# Altium footprint library PcbLib_jp.PcbLib: 255 footprints (part 12 of 16)
Each footprint in its own frame and in the unit in brackets; x right, y up, seen from the top. Pads: shape width x height; smd on the part's side, far side on the other; paste and mask are expansions set on the pad; w line width, h text height; cw(c..) or ccw(c..) is an arc to the next point about the centre after c.
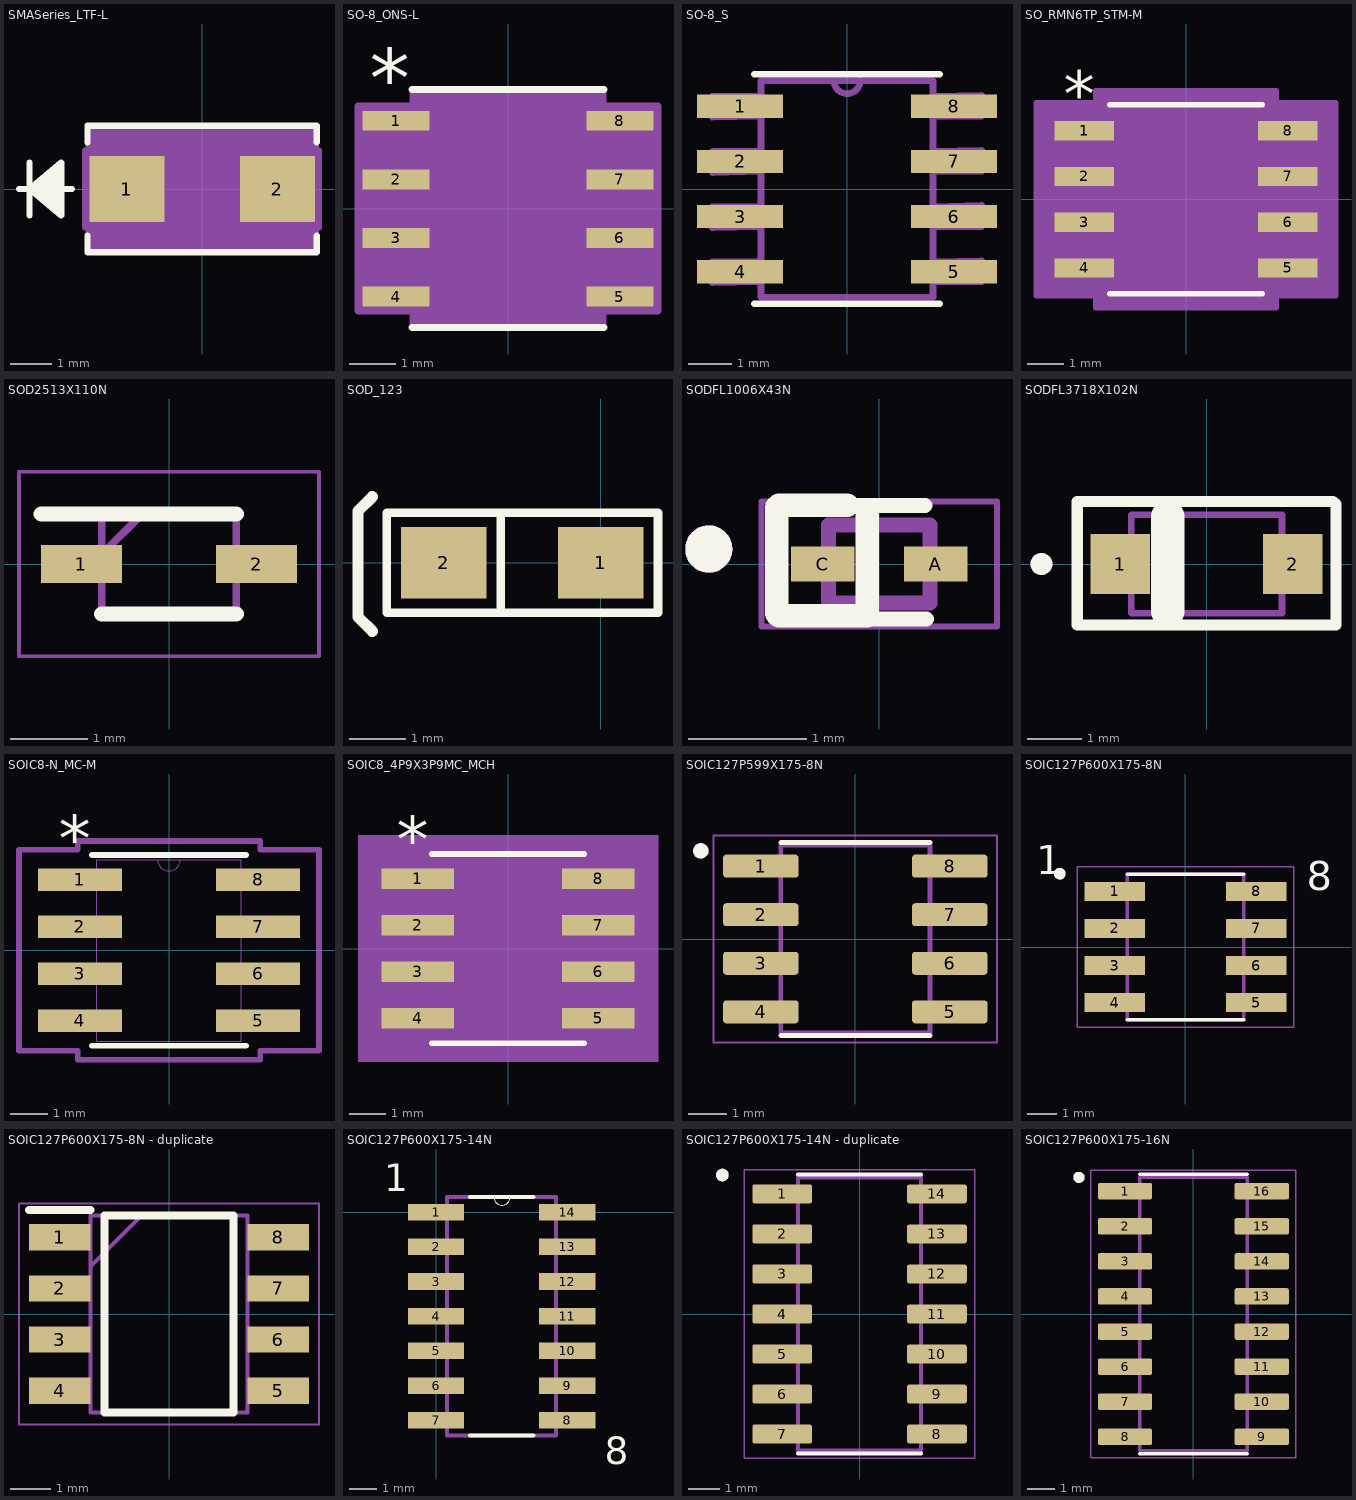
[diagram p11: the footprints below, top view; thin cyan lines are the x and y axes]

## SMASeries_LTF-L [mil]
pads (2):
  rect 71x63 smd paste+0 mask+0: 1(-71.5,0) 2(71.5,0)
Top Overlay:
  lines w6: -174,0 -124,0 ; -164,-25 -164,25 ; -134,-20 -164,0 ; -134,-15 -164,0 ; -134,-10 -164,0 ; -134,-5 -164,0 ; -134,5 -164,0 ; -134,10 -164,0 ; -134,15 -164,0 ; -134,20 -164,0 ; -109,-44.45 -109,-60 109,-60 109,-44.45 ; -109,44.45 -109,60 109,60 109,44.45 ; -164,0 -134,25 -134,-25 -164,0
Mechanical 13:
  lines w1: -174,0 -124,0 ; -164,-25 -164,25 ; -134,-20 -164,0 ; -134,-15 -164,0 ; -134,-10 -164,0 ; -134,-5 -164,0 ; -134,5 -164,0 ; -134,10 -164,0 ; -134,15 -164,0 ; -134,20 -164,0 ; -164,0 -134,25 -134,-25 -164,0 ; -104,-55 104,-55 104,55 -104,55 -104,-55
Mechanical 15:
  region: -108,-36.5 -111,-36.5 -111,36.5 -108,36.5 -108,59 108,59 108,36.5 111,36.5 111,-36.5 108,-36.5 108,-59 -108,-59
  lines w6: -111,-36.5 -111,36.5 -108,36.5 -108,59 108,59 108,36.5 111,36.5 111,-36.5 108,-36.5 108,-59 -108,-59 -108,-36.5 -111,-36.5
3D body "SMASeries_LTF.step": height 92.01, standoff 0, extent -104.02,-55 104.02,55

## SO-8_ONS-L [mil]
pads (8):
  rect 57x17 smd paste+0 mask+0: 1(-95.5,75) 2(-95.5,25) 3(-95.5,-25) 4(-95.5,-75) 5(95.5,-75) 6(95.5,-25) 7(95.5,25) 8(95.5,75)
Top Overlay:
  lines w6: -82,-101.5 82,-101.5 ; -82,101.5 82,101.5
  text "*" at -118,87 h50
Mechanical 13:
  lines w0: -12,96.5 ccw(c0,96.5) 12,96.5
  lines w1: -118,-83.5 -77,-83.5 -77,-66.5 -118,-66.5 -118,-83.5 ; -118,-33.5 -77,-33.5 -77,-16.5 -118,-16.5 -118,-33.5 ; -118,16.5 -77,16.5 -77,33.5 -118,33.5 -118,16.5 ; -118,66.5 -77,66.5 -77,83.5 -118,83.5 -118,66.5 ; -77,-96.5 -77,96.5 77,96.5 77,-96.5 -77,-96.5 ; 77,-83.5 118,-83.5 118,-66.5 77,-66.5 77,-83.5 ; 77,-33.5 118,-33.5 118,-16.5 77,-16.5 77,-33.5 ; 77,16.5 118,16.5 118,33.5 77,33.5 77,16.5 ; 77,66.5 118,66.5 118,83.5 77,83.5 77,66.5
  text "*" at -74.5,43.5 h50
Mechanical 15:
  region: -81,-87.5 -128,-87.5 -128,87.5 -81,87.5 -81,100.5 81,100.5 81,87.5 128,87.5 128,-87.5 81,-87.5 81,-100.5 -81,-100.5
  lines w6: -128,-87.5 -81,-87.5 -81,-100.5 81,-100.5 81,-87.5 128,-87.5 128,87.5 81,87.5 81,100.5 -81,100.5 -81,87.5 -128,87.5 -128,-87.5
3D body "SO-8_ONS.step": height 69.09, standoff 0, extent -117.99,-96.5 117.99,96.5

## SO-8_S [mil]
pads (8):
  rect 78x21 smd: 1(-97,75) 2(-97,25) 3(-97,-25) 4(-97,-75) 5(97,-75) 6(97,-25) 7(97,25) 8(97,75)
Top Overlay:
  lines w6: -84,-104 84,-104 ; -84,104 84,104
Mechanical 13:
  lines w6: -12,98.08 ccw(c0,98.5) 12,98.92 ; -122,-85 -122,-66 -78,-66 -78,-84 -122,-85 ; -122,-35 -122,-16 -78,-16 -78,-34 -122,-35 ; -122,15 -122,34 -78,34 -78,16 -122,15 ; -122,65 -122,84 -78,84 -78,66 -122,65 ; -78,-98 78,-98 78,98 -12,98 -78,98 -78,-98 ; 78,-84 78,-66 122,-65 122,-84 78,-84 ; 78,-34 78,-16 122,-15 122,-34 78,-34 ; 78,16 78,34 122,35 122,16 78,16 ; 78,66 78,84 122,85 122,66 78,66
3D body "CircuitWorks-SO-8.STEP": height 104.24, standoff 47.24, extent -121.62,-98.43 105.87,94.57

## SO_RMN6TP_STM-M [mil]
pads (8):
  rect 65.5x21 smd paste+0 mask+0: 1(-111.25,75) 2(-111.25,25) 3(-111.25,-25) 4(-111.25,-75) 5(111.25,-75) 6(111.25,-25) 7(111.25,25) 8(111.25,75)
Top Overlay:
  lines w6: -83.5,-103.5 83.5,-103.5 ; -83.5,103.5 83.5,103.5
  text "*" at -133.75,91 h50
Mechanical 13:
  lines w0: -12,98.5 ccw(c0,98.5) 12,98.5
  lines w1: -122,-84.5 -78.5,-84.5 -78.5,-65.5 -122,-65.5 -122,-84.5 ; -122,-34.5 -78.5,-34.5 -78.5,-15.5 -122,-15.5 -122,-34.5 ; -122,15.5 -78.5,15.5 -78.5,34.5 -122,34.5 -122,15.5 ; -122,65.5 -78.5,65.5 -78.5,84.5 -122,84.5 -122,65.5 ; -78.5,-98.5 -78.5,98.5 78.5,98.5 78.5,-98.5 -78.5,-98.5 ; 78.5,-84.5 122,-84.5 122,-65.5 78.5,-65.5 78.5,-84.5 ; 78.5,-34.5 122,-34.5 122,-15.5 78.5,-15.5 78.5,-34.5 ; 78.5,15.5 122,15.5 122,34.5 78.5,34.5 78.5,15.5 ; 78.5,65.5 122,65.5 122,84.5 78.5,84.5 78.5,65.5
  text "*" at -76,45.5 h50
Mechanical 15:
  region: -98.5,-105.5 -164,-105.5 -164,105.5 -98.5,105.5 -98.5,118.5 98.5,118.5 98.5,105.5 164,105.5 164,-105.5 98.5,-105.5 98.5,-118.5 -98.5,-118.5
  lines w6: -164,-105.5 -98.5,-105.5 -98.5,-118.5 98.5,-118.5 98.5,-105.5 164,-105.5 164,105.5 98.5,105.5 98.5,118.5 -98.5,118.5 -98.5,105.5 -164,105.5 -164,-105.5
3D body "SO_RMN6TP_STM.step": height 69.09, standoff 0, extent -122.01,-98.5 122.01,98.5

## SOD2513X110N [mm]
pads (2):
  rect 1.05x0.5 smd: 1(-1.138,0) 2(1.138,0)
Top Overlay:
  lines w0.2: -1.662,0.65 0.875,0.65 ; -0.875,-0.65 0.875,-0.65
Mechanical 13:
  lines w0.1: -0.875,0.125 -0.35,0.65 ; -0.875,-0.65 -0.875,0.65 0.875,0.65 0.875,-0.65 -0.875,-0.65
Mechanical 15:
  lines w0.05: -1.95,-1.2 -1.95,1.2 1.95,1.2 1.95,-1.2 -1.95,-1.2
3D body "BAT60AE6327HTSA1.stp": height 1.1, standoff 0, extent -1.25,-0.65 1.25,0.65

## SOD_123 [mil]
pads (2):
  rect 60x50 smd: 1(0,0) 2(-110,0)
Top Overlay:
  lines w1: -150,-35 25,-35 40,-35 40,35 -150,35 -150,-35
  lines w6: 40,-35 0,-35 -150,-35 -150,35 40,35 ; 40,-35 40,35 ; 40,-35 -70,-35 -70,35 -53,35 40,35 ; 40,-35 40,35
  lines w7.87: -160,-48 -170,-38 -170,36 -160,46
3D body "CircuitWorks-SOD123.STEP": height 50, standoff 0, extent -126.84,-31.5 18.83,31.5

## SODFL1006X43N [mm]
pads (2):
  rect 0.54x0.3 smd: A(0.48,0) C(-0.48,0)
Top Overlay:
  circle w0.2: c-1.446,0.127 r0.1
  lines w0.127: -0.41,0.495 0.39,0.495 ; -0.4,-0.465 0.4,-0.465
  lines w0.2: -0.87,0.48 -0.87,-0.42 -0.85,-0.44 -0.1,-0.44 -0.1,0.41 ; -0.85,0.5 -0.27,0.5
Mechanical 13:
  circle w0.2: c-1.446,0.127 r0.1
  lines w0.127: -0.43,-0.33 0.43,-0.33 0.43,0.33 -0.43,0.33 -0.43,-0.33
Mechanical 15:
  lines w0.05: -1,-0.53 1,-0.53 1,0.53 -1,0.53 -1,-0.53

## SODFL3718X102N [mm]
height 1.02
pads (2):
  rect 1.08x1.09 smd: 1(-1.575,0) 2(1.575,0)
Top Overlay:
  circle w0.2: c-3.015,0 r0.1
  lines w0.203: -2.362,-1.118 2.362,-1.118 2.362,1.092 2.311,1.143 -2.362,1.143 ; -2.362,-1.092 -2.362,1.118
  lines w0.61: -0.711,-0.864 -0.711,0.864
Mechanical 13:
  circle w0.2: c-3.015,0 r0.1
  lines w0.127: -1.375,-0.9 -1.375,0.9 1.375,0.9 1.375,-0.9 -1.375,-0.9
Mechanical 15:
  lines w0.05: -2.365,-1.15 -2.365,1.15 2.365,1.15 2.365,-1.15 -2.365,-1.15
3D body "User Library-SOD123W-1.STEP": height 1.1, standoff -0.01, extent -1.825,-0.95 1.875,0.95

## SOIC8-N_MC-M [mm]
pads (8):
  rect 2.27x0.608 smd paste+0 mask+0: 1(-2.412,1.905) 2(-2.412,0.635) 3(-2.412,-0.635) 4(-2.412,-1.905) 5(2.412,-1.905) 6(2.412,-0.635) 7(2.412,0.635) 8(2.412,1.905)
Top Overlay:
  lines w0.152: -2.083,-2.578 2.083,-2.578 ; -2.083,2.578 2.083,2.578
  text "*" at -2.984,2.386 h1.27
Mechanical 13:
  lines w0: -0.305,2.451 ccw(c0,2.451) 0.305,2.451
  lines w0.025: -2.997,-2.159 -2.997,-1.651 -1.956,-1.651 -1.956,-2.159 -2.997,-2.159 ; -2.997,-0.889 -2.997,-0.381 -1.956,-0.381 -1.956,-0.889 -2.997,-0.889 ; -2.997,0.381 -2.997,0.889 -1.956,0.889 -1.956,0.381 -2.997,0.381 ; -2.997,1.651 -2.997,2.159 -1.956,2.159 -1.956,1.651 -2.997,1.651 ; -1.956,-2.451 1.956,-2.451 1.956,2.451 -1.956,2.451 -1.956,-2.451 ; 1.956,-2.159 1.956,-1.651 2.997,-1.651 2.997,-2.159 1.956,-2.159 ; 1.956,-0.889 1.956,-0.381 2.997,-0.381 2.997,-0.889 1.956,-0.889 ; 1.956,0.381 1.956,0.889 2.997,0.889 2.997,0.381 1.956,0.381 ; 1.956,1.651 1.956,2.159 2.997,2.159 2.997,1.651 1.956,1.651
  text "*" at -1.892,1.105 h1.27
Mechanical 16:
  lines w0.152: -4.055,-2.717 -4.055,2.717 -2.464,2.717 -2.464,2.959 2.464,2.959 2.464,2.717 4.055,2.717 4.055,-2.717 2.464,-2.717 2.464,-2.959 -2.464,-2.959 -2.464,-2.717 -4.055,-2.717
3D body: height 0.25, standoff 0, extent 0,0 0.254,0.254
3D body "SOIC8-N_MC-M.step": height 1.76, standoff 0, extent -3.098,-2.451 2.896,2.451

## SOIC8_4P9X3P9MC_MCH [mil] "Authentication Chip 8-SOIC"
pads (8):
  rect 78x22 smd paste+0 mask+0: 1(-97,75) 2(-97,25) 3(-97,-25) 4(-97,-75) 5(97,-75) 6(97,-25) 7(97,25) 8(97,75)
Top Overlay:
  lines w6: -82,-101.5 82,-101.5 ; -82,101.5 82,101.5
  text "*" at -119.5,92 h50
Mechanical 5:
  region: 161,-121.5 -161,-121.5 -161,121.5 161,121.5
Mechanical 13:
  lines w0: -12,96.5 ccw(c0,96.5) 12,96.5
  lines w1: -122,-85 -122,-65 -77,-65 -77,-85 -122,-85 ; -122,-35 -122,-15 -77,-15 -77,-35 -122,-35 ; -122,15 -122,35 -77,35 -77,15 -122,15 ; -122,65 -122,85 -77,85 -77,65 -122,65 ; -77,-96.5 77,-96.5 77,96.5 -77,96.5 -77,-96.5 ; 77,-85 77,-65 122,-65 122,-85 77,-85 ; 77,-35 77,-15 122,-15 122,-35 77,-35 ; 77,15 77,35 122,35 122,15 77,15 ; 77,65 77,85 122,85 122,65 77,65
  text "*" at -74.5,43.5 h50
Mechanical 15:
  region: -87,-96 -146,-96 -146,96 -87,96 -87,106.5 87,106.5 87,96 146,96 146,-96 87,-96 87,-106.5 -87,-106.5
  lines w6: -146,-96 -146,96 -87,96 -87,106.5 87,106.5 87,96 146,96 146,-96 87,-96 87,-106.5 -87,-106.5 -87,-96 -146,-96
3D body "SOIC8_4P9X3P9MC_MCH.step": height 69.02, standoff 0, extent -125.15,-95.7 118.86,97.29
3D body "SOIC8_4P9X3P9MC_MCH.step": height 69.02, standoff 0, extent -122.01,-96.5 122.01,96.5

## SOIC127P599X175-8N [mm]
pads (8):
  rrect25% 1.97x0.6 smd: 1(-2.47,1.905) 2(-2.47,0.635) 3(-2.47,-0.635) 4(-2.47,-1.905) 5(2.47,-1.905) 6(2.47,-0.635) 7(2.47,0.635) 8(2.47,1.905)
Top Overlay:
  circle w0.2: c-4.04,2.305 r0.1
  lines w0.127: -1.95,-2.525 1.95,-2.525 ; -1.95,2.525 1.95,2.525
Mechanical 13:
  circle w0.2: c-4.04,2.305 r0.1
  lines w0.127: -1.95,-2.452 -1.95,2.452 1.95,2.452 1.95,-2.452 -1.95,-2.452
Mechanical 15:
  lines w0.05: -3.705,-2.702 -3.705,2.702 3.705,2.702 3.705,-2.702 -3.705,-2.702
3D body "NE555DR.step": height 1.75, standoff 0, extent -3.07,-2.42 2.93,2.48

## SOIC127P600X175-8N [mm]
pads (8):
  rect 2.07x0.66 smd: 1(-2.425,1.905) 2(-2.425,0.635) 3(-2.425,-0.635) 4(-2.425,-1.905) 5(2.425,-1.905) 6(2.425,-0.635) 7(2.425,0.635) 8(2.425,1.905)
Top Overlay:
  circle w0.2: c-4.315,2.515 r0.1
  lines w0.127: -2,-2.5 2,-2.5 ; -2,2.5 2,2.5
  text "1" at -5.131,2.489 h1
  text "8" at 4.166,1.956 h1
Mechanical 13:
  circle w0.2: c-4.315,2.515 r0.1
  circle w0.2: c-4.315,2.515 r0.1
  lines w0.127: -2,-2.5 -2,2.5 ; -2,-2.5 2,-2.5 ; -2,-2.5 -2,2.5 ; -2,-2.5 2,-2.5 ; -2,2.5 2,2.5 ; -2,2.5 2,2.5 ; 2,-2.5 2,2.5 ; 2,-2.5 2,2.5
Mechanical 16:
  lines w0.05: -3.71,-2.75 -3.71,2.75 3.71,2.75 3.71,-2.75 -3.71,-2.75
3D body "User Library-so8-3.STEP": height 1.7, standoff 0, extent -3.025,-2.4 2.975,2.5

## SOIC127P600X175-8N - duplicate [mm]
pads (8):
  rect 1.525x0.65 smd: 1(-2.712,1.905) 2(-2.712,0.635) 3(-2.712,-0.635) 4(-2.712,-1.905) 5(2.712,-1.905) 6(2.712,-0.635) 7(2.712,0.635) 8(2.712,1.905)
Top Overlay:
  lines w0.2: -3.475,2.58 -1.95,2.58 ; -1.6,-2.45 -1.6,2.45 1.6,2.45 1.6,-2.45 -1.6,-2.45
Mechanical 13:
  lines w0.1: -1.95,1.18 -0.68,2.45 ; -1.95,-2.45 -1.95,2.45 1.95,2.45 1.95,-2.45 -1.95,-2.45
Mechanical 15:
  lines w0.05: -3.725,-2.75 -3.725,2.75 3.725,2.75 3.725,-2.75 -3.725,-2.75
3D body "NE555DR.stp": height 1.75, standoff 0, extent -3,-2.45 3,2.45

## SOIC127P600X175-14N [mil]
pads (14):
  rect 81x24 smd: 1(0,0) 2(0,-50) 3(0,-100) 4(0,-150) 5(0,-200) 6(0,-250) 7(0,-300) 8(189,-300) 9(189,-250) 10(189,-200) 11(189,-150) 12(189,-100) 13(189,-50) 14(189,0)
Top Overlay:
  lines w0: 83,22 ccw(c95,22) 107,22
  lines w6: 49,-322 140,-322 ; 49,22 83,22 107,22 140,22
  text "1" at -75,30 h39.37
  text "8" at 243,-363 h39.37
Mechanical 13:
  lines w0: 83,22 ccw(c95,22) 107,22 cw(c95,22) 83,22
  lines w6: 16,-322 173,-322 ; 16,-322 16,22 ; 16,-322 173,-322 ; 16,-322 16,22 ; 16,22 83,22 ; 16,22 83,22 ; 83,22 107,22 ; 83,22 107,22 ; 107,22 173,22 ; 107,22 173,22 ; 173,-322 173,22 ; 173,-322 173,22 ; 0,-300 16,-300 0,-300 ; 0,-250 16,-250 0,-250 ; 0,-200 16,-200 0,-200 ; 0,-150 16,-150 0,-150 ; 0,-100 16,-100 0,-100 ; 0,-50 16,-50 0,-50 ; 0,0 16,0 0,0 ; 173,-300 189,-300 173,-300 ; 173,-250 189,-250 173,-250 ; 173,-200 189,-200 173,-200 ; 173,-150 189,-150 173,-150 ; 173,-100 189,-100 173,-100 ; 173,-50 189,-50 173,-50 ; 173,0 189,0 173,0
3D body: height 69.02, standoff 0, extent -53.54,21.65 -53.54,21.65
3D body "SL.STEP": height 68.9, standoff 0, extent -23.12,-318.6 212.9,21.76

## SOIC127P600X175-14N - duplicate [mm]
pads (14):
  rrect25% 1.9x0.6 smd: 1(-2.455,3.81) 2(-2.455,2.54) 3(-2.455,1.27) 4(-2.455,0) 5(-2.455,-1.27) 6(-2.455,-2.54) 7(-2.455,-3.81) 8(2.455,-3.81) 9(2.455,-2.54) 10(2.455,-1.27) 11(2.455,0) 12(2.455,1.27) 13(2.455,2.54) 14(2.455,3.81)
Top Overlay:
  circle w0.2: c-4.355,4.41 r0.1
  lines w0.127: -1.95,-4.43 1.95,-4.43 ; -1.95,4.43 1.95,4.43
Mechanical 13:
  circle w0.2: c-4.355,4.41 r0.1
  lines w0.127: -1.95,-4.325 1.95,-4.325 1.95,4.325 -1.95,4.325 -1.95,-4.325
Mechanical 15:
  lines w0.05: -3.655,-4.575 3.655,-4.575 3.655,4.575 -3.655,4.575 -3.655,-4.575

## SOIC127P600X175-16N [mm]
pads (16):
  rrect25% 1.97x0.6 smd: 1(-2.475,4.445) 2(-2.475,3.175) 3(-2.475,1.905) 4(-2.475,0.635) 5(-2.475,-0.635) 6(-2.475,-1.905) 7(-2.475,-3.175) 8(-2.475,-4.445) 9(2.475,-4.445) 10(2.475,-3.175) 11(2.475,-1.905) 12(2.475,-0.635) 13(2.475,0.635) 14(2.475,1.905) 15(2.475,3.175) 16(2.475,4.445)
Top Overlay:
  circle w0.2: c-4.145,4.945 r0.1
  lines w0.127: -1.95,-5.065 1.95,-5.065 ; -1.95,5.065 1.95,5.065
Mechanical 13:
  circle w0.2: c-4.145,4.945 r0.1
  lines w0.127: -1.95,-4.95 -1.95,4.95 1.95,4.95 1.95,-4.95 -1.95,-4.95
Mechanical 15:
  lines w0.05: -3.71,-5.2 -3.71,5.2 3.71,5.2 3.71,-5.2 -3.71,-5.2
3D body "step_temp.STEP": height 1.75, standoff 0, extent -3,-4.95 3,4.95